# Altium footprint library OT Library.PcbLib: 396 footprints (part 16 of 25)
Each footprint in its own frame and in the unit in brackets; x right, y up, seen from the top. Pads: shape width x height; smd on the part's side, far side on the other; paste and mask are expansions set on the pad; w line width, h text height; cw(c..) or ccw(c..) is an arc to the next point about the centre after c.
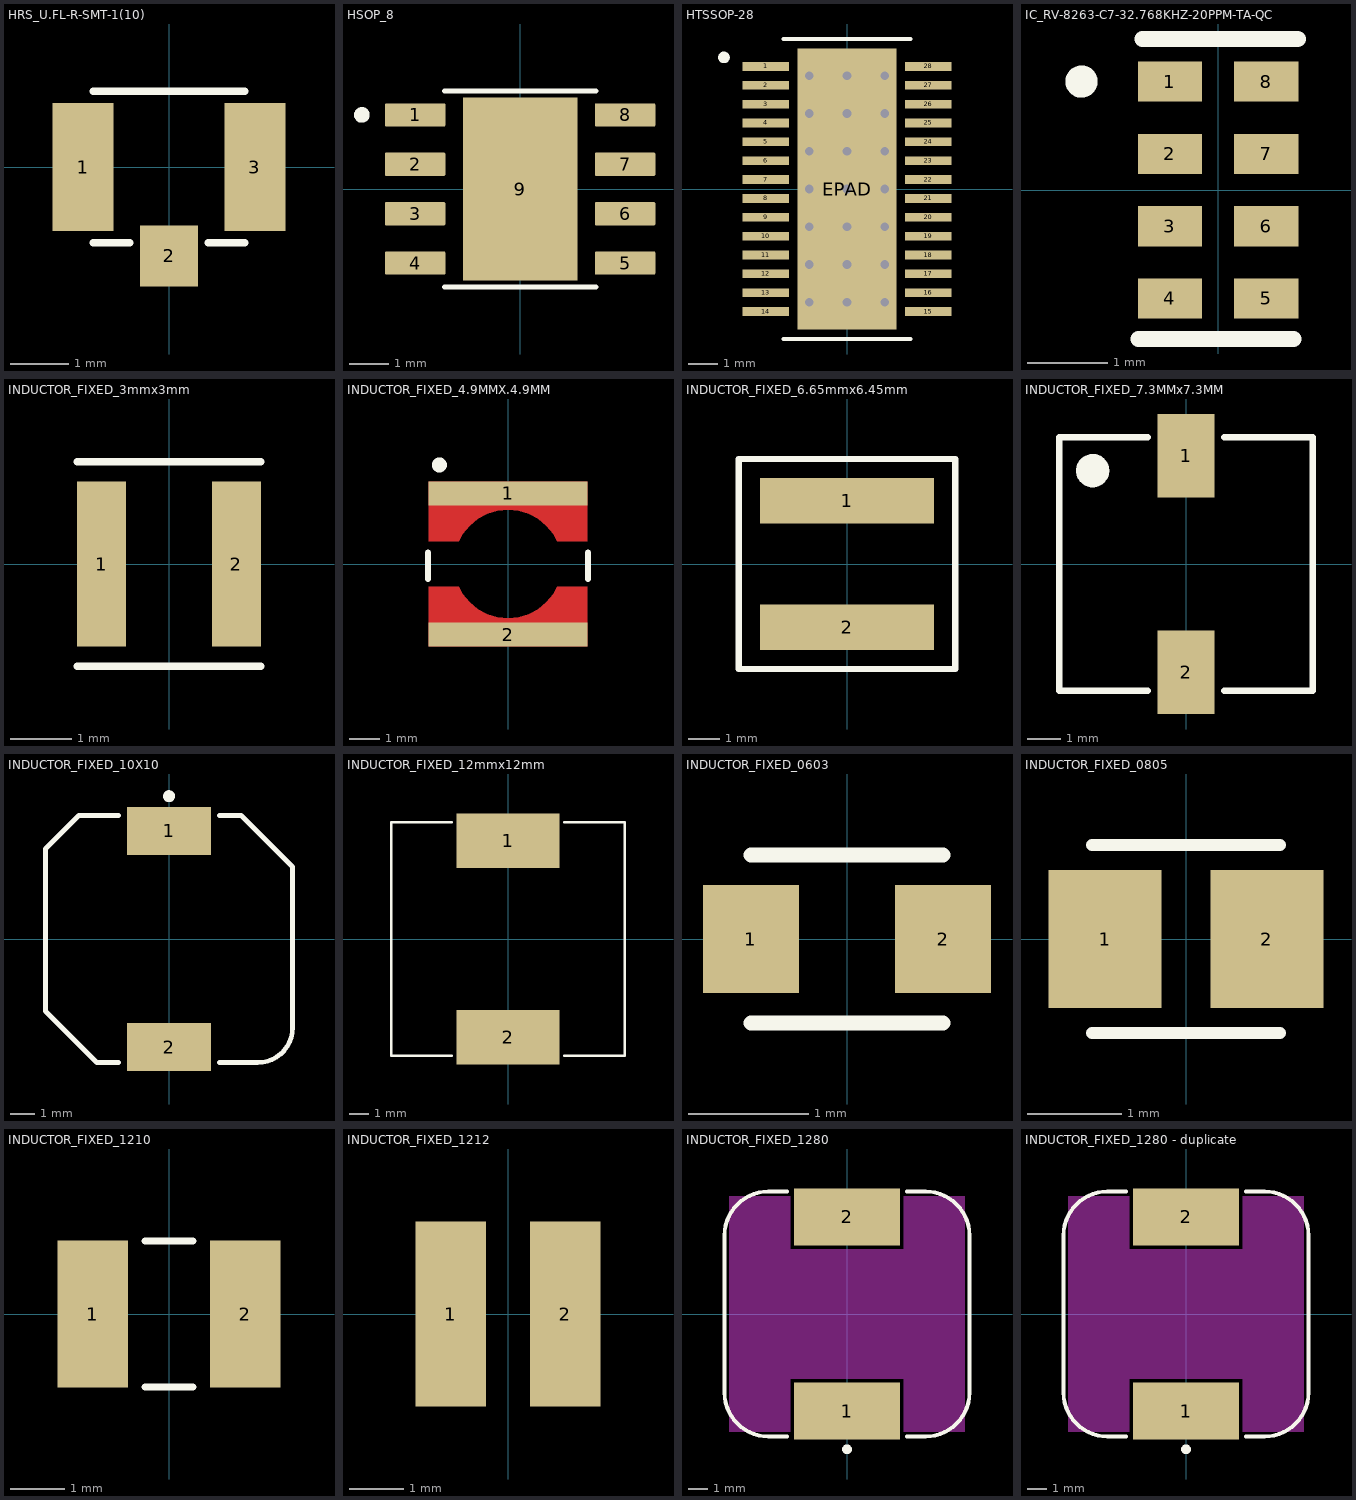
[diagram p15: the footprints below, top view; thin cyan lines are the x and y axes]

## HRS_U.FL-R-SMT-1(10) [mm]
pads (3):
  rect 1.05x2.2 smd: 1(-1.475,0) 3(1.475,0)
  rect 1x1.05 smd: 2(0,-1.525)
Top Overlay:
  lines w0.127: -1.3,-1.3 -0.67,-1.3 ; -1.3,1.3 1.3,1.3 ; 0.67,-1.3 1.3,-1.3
3D body: height 1.26, standoff 0.01, extent -1.5,-1.55 1.5,1.55

## HSOP_8 [mm]
height 1.7
pads (9):
  rrect10% 1.55x0.6 smd mask+0: 1(-2.7,1.905) 2(-2.7,0.635) 3(-2.7,-0.635) 4(-2.7,-1.905) 5(2.7,-1.905) 6(2.7,-0.635) 7(2.7,0.635) 8(2.7,1.905)
  rect 2.95x4.7 smd paste-3 mask+0: 9(0,0)
Top Overlay:
  circle w0.2: c-4.07,1.905 r0.1
  lines w0.127: -1.95,-2.525 1.95,-2.525 ; -1.95,2.525 1.95,2.525
Top Paste:
  region: 1.3,-1.55 -1.3,-1.55 -1.3,1.55 1.3,1.55
Top Solder:
  drawing of 9 lines, arcs and shapes, not listed
3D body: height 1.7, standoff 0, extent -3,-2.45 3,2.45

## HTSSOP-28 [mm]
pads (50):
  rect 1.6x0.3 smd paste-2 mask+0: 1(-2.8,4.225) 2(-2.8,3.575) 3(-2.8,2.925) 4(-2.8,2.275) 5(-2.8,1.625) 6(-2.8,0.975) 7(-2.8,0.325) 8(-2.8,-0.325) 9(-2.8,-0.975) 10(-2.8,-1.625) 11(-2.8,-2.275) 12(-2.8,-2.925) 13(-2.8,-3.575) 14(-2.8,-4.225) 15(2.8,-4.225) 16(2.8,-3.575) 17(2.8,-2.925) 18(2.8,-2.275) 19(2.8,-1.625) 20(2.8,-0.975) 21(2.8,-0.325) 22(2.8,0.325) 23(2.8,0.975) 24(2.8,1.625) 25(2.8,2.275) 26(2.8,2.925) 27(2.8,3.575) 28(2.8,4.225)
  round 0.5 hole 0.3 mask+0: EPAD(-1.3,-3.9) EPAD(-1.3,-2.6) EPAD(-1.3,-1.3) EPAD(-1.3,0) EPAD(-1.3,1.3) EPAD(-1.3,2.6) EPAD(-1.3,3.9) EPAD(0,-3.9) EPAD(0,-2.6) EPAD(0,-1.3) EPAD(0,0) EPAD(0,1.3) EPAD(0,2.6) EPAD(0,3.9) EPAD(1.3,-3.9) EPAD(1.3,-2.6) EPAD(1.3,-1.3) EPAD(1.3,0) EPAD(1.3,1.3) EPAD(1.3,2.6) EPAD(1.3,3.9)
  rect 3.4x9.7 smd paste-6 mask+0: EPAD(0,0)
Top Overlay:
  circle w0.2: c-4.24,4.535 r0.1
  lines w0.127: -2.2,-5.17 2.2,-5.17 ; -2.2,5.17 2.2,5.17
Top Paste:
  region: 1.2,-3.23 -1.2,-3.23 -1.2,3.23 1.2,3.23
  region: -2.025,4.1 -3.575,4.1 -3.575,4.35 -2.025,4.35
  region: 3.575,4.1 2.025,4.1 2.025,4.35 3.575,4.35
  region: -2.025,3.45 -3.575,3.45 -3.575,3.7 -2.025,3.7
  region: 3.575,3.45 2.025,3.45 2.025,3.7 3.575,3.7
  region: -2.025,2.8 -3.575,2.8 -3.575,3.05 -2.025,3.05
  region: 3.575,2.8 2.025,2.8 2.025,3.05 3.575,3.05
  region: -2.025,2.15 -3.575,2.15 -3.575,2.4 -2.025,2.4
  region: 3.575,2.15 2.025,2.15 2.025,2.4 3.575,2.4
  region: -2.025,1.5 -3.575,1.5 -3.575,1.75 -2.025,1.75
  region: 3.575,1.5 2.025,1.5 2.025,1.75 3.575,1.75
  region: -2.025,0.85 -3.575,0.85 -3.575,1.1 -2.025,1.1
  region: 3.575,0.85 2.025,0.85 2.025,1.1 3.575,1.1
  region: -2.025,0.2 -3.575,0.2 -3.575,0.45 -2.025,0.45
  region: 3.575,0.2 2.025,0.2 2.025,0.45 3.575,0.45
  region: -2.025,-0.45 -3.575,-0.45 -3.575,-0.2 -2.025,-0.2
  region: -2.025,-1.1 -3.575,-1.1 -3.575,-0.85 -2.025,-0.85
  region: -2.025,-1.75 -3.575,-1.75 -3.575,-1.5 -2.025,-1.5
  region: -2.025,-2.4 -3.575,-2.4 -3.575,-2.15 -2.025,-2.15
  region: -2.025,-3.05 -3.575,-3.05 -3.575,-2.8 -2.025,-2.8
  region: -2.025,-3.7 -3.575,-3.7 -3.575,-3.45 -2.025,-3.45
  region: -2.025,-4.35 -3.575,-4.35 -3.575,-4.1 -2.025,-4.1
  region: 3.575,-0.45 2.025,-0.45 2.025,-0.2 3.575,-0.2
  region: 3.575,-1.1 2.025,-1.1 2.025,-0.85 3.575,-0.85
  region: 3.575,-1.75 2.025,-1.75 2.025,-1.5 3.575,-1.5
  region: 3.575,-2.4 2.025,-2.4 2.025,-2.15 3.575,-2.15
  region: 3.575,-3.05 2.025,-3.05 2.025,-2.8 3.575,-2.8
  region: 3.575,-3.7 2.025,-3.7 2.025,-3.45 3.575,-3.45
  region: 3.575,-4.35 2.025,-4.35 2.025,-4.1 3.575,-4.1
Top Solder:
  region: 1.2,-3.23 -1.2,-3.23 -1.2,3.23 1.2,3.23
  region: -1.93,4.005 -3.67,4.005 -3.67,4.445 -1.93,4.445
  region: 3.67,4.005 1.93,4.005 1.93,4.445 3.67,4.445
  region: -1.93,3.355 -3.67,3.355 -3.67,3.795 -1.93,3.795
  region: 3.67,3.355 1.93,3.355 1.93,3.795 3.67,3.795
  region: -1.93,2.705 -3.67,2.705 -3.67,3.145 -1.93,3.145
  region: 3.67,2.705 1.93,2.705 1.93,3.145 3.67,3.145
  region: -1.93,2.055 -3.67,2.055 -3.67,2.495 -1.93,2.495
  region: 3.67,2.055 1.93,2.055 1.93,2.495 3.67,2.495
  region: -1.93,1.405 -3.67,1.405 -3.67,1.845 -1.93,1.845
  region: 3.67,1.405 1.93,1.405 1.93,1.845 3.67,1.845
  region: -1.93,0.755 -3.67,0.755 -3.67,1.195 -1.93,1.195
  region: 3.67,0.755 1.93,0.755 1.93,1.195 3.67,1.195
  region: -1.93,0.105 -3.67,0.105 -3.67,0.545 -1.93,0.545
  region: 3.67,0.105 1.93,0.105 1.93,0.545 3.67,0.545
  region: -1.93,-0.545 -3.67,-0.545 -3.67,-0.105 -1.93,-0.105
  region: -1.93,-1.195 -3.67,-1.195 -3.67,-0.755 -1.93,-0.755
  region: -1.93,-1.845 -3.67,-1.845 -3.67,-1.405 -1.93,-1.405
  region: -1.93,-2.495 -3.67,-2.495 -3.67,-2.055 -1.93,-2.055
  region: -1.93,-3.145 -3.67,-3.145 -3.67,-2.705 -1.93,-2.705
  region: -1.93,-3.795 -3.67,-3.795 -3.67,-3.355 -1.93,-3.355
  region: -1.93,-4.445 -3.67,-4.445 -3.67,-4.005 -1.93,-4.005
  region: 3.67,-0.545 1.93,-0.545 1.93,-0.105 3.67,-0.105
  region: 3.67,-1.195 1.93,-1.195 1.93,-0.755 3.67,-0.755
  region: 3.67,-1.845 1.93,-1.845 1.93,-1.405 3.67,-1.405
  region: 3.67,-2.495 1.93,-2.495 1.93,-2.055 3.67,-2.055
  region: 3.67,-3.145 1.93,-3.145 1.93,-2.705 3.67,-2.705
  region: 3.67,-3.795 1.93,-3.795 1.93,-3.355 3.67,-3.355
  region: 3.67,-4.445 1.93,-4.445 1.93,-4.005 3.67,-4.005
3D body: height 1.2, standoff 0, extent -3.2,-4.85 3.2,4.85

## IC_RV-8263-C7-32.768KHZ-20PPM-TA-QC [mm]
height 0.8
pads (8):
  rect 0.8x0.5 smd: 1(-0.6,1.35) 2(-0.6,0.45) 3(-0.6,-0.45) 4(-0.6,-1.35) 5(0.6,-1.35) 6(0.6,-0.45) 7(0.6,0.45) 8(0.6,1.35)
Top Overlay:
  circle w0.2: c-1.7,1.35 r0.1
  lines w0.2: -0.991,-1.854 0.94,-1.854 ; -0.94,1.88 0.991,1.88
3D body: height 0.8, standoff 0, extent -0.75,-1.6 0.75,1.6

## INDUCTOR_FIXED_3mmx3mm [mm] "0.118\" L x 0.118\" W (3.00mm x 3.00mm)"
pads (2):
  rect 0.8x2.7 smd: 1(-1.1,0) 2(1.1,0)
Top Overlay:
  lines w0.127: -1.5,-1.67 1.5,-1.67 ; -1.5,1.67 1.5,1.67
3D body: height 1.2, standoff 0, extent -1.5,-1.5 1.5,1.5

## INDUCTOR_FIXED_4.9MMX.4.9MM [mm] "5030"
height 2.85
pads (2):
  rect 5.3x0.8 smd: 1(0,2.35) 2(0,-2.35)
Top Layer:
  region: -2.65,0.75 -2.65,2.75 2.65,2.75 2.65,0.75 1.639,0.751 1.504,1.005 1.279,1.279 1.005,1.504 0.692,1.671 0.353,1.774 0,1.809 -0.353,1.774 -0.692,1.671 -1.005,1.504 -1.279,1.279 -1.504,1.005 -1.638,0.754 -1.635,0.752 -1.635,0.75
  region: -2.65,-0.75 -2.65,-2.75 2.65,-2.75 2.65,-0.75 1.639,-0.751 1.504,-1.005 1.279,-1.279 1.005,-1.504 0.692,-1.671 0.353,-1.774 0,-1.809 -0.353,-1.774 -0.692,-1.671 -1.005,-1.504 -1.279,-1.279 -1.504,-1.005 -1.638,-0.754 -1.635,-0.752 -1.635,-0.75
Top Overlay:
  circle w0.25: c-2.286,3.302 r0.125
  lines w0.2: -2.667,-0.508 -2.667,0.381 ; 2.667,-0.508 2.667,0.381
Test Points Top:
  text ".Designator" at -5.998,-0.4 h1.2
3D body: height 2.85, standoff 0, extent -2.45,-2.45 2.45,2.45

## INDUCTOR_FIXED_6.65mmx6.45mm [mm] "SMT Power Inductor, 2-Leads, body 6.65x6.45mm"
height 3
pads (2):
  rect 5.5x1.45 smd: 1(0,2) 2(0,-2)
Top Overlay:
  lines w0.2: -3.425,-3.325 3.425,-3.325 3.425,3.325 -3.425,3.325 -3.425,-3.325
3D body: height 3, standoff 0, extent -3.325,-3.225 3.325,3.225

## INDUCTOR_FIXED_7.3MMx7.3MM [mm] "SMD Shielded Power Inductor, 2-leads, body 7.3x7.3mm"
height 3.5
pads (2):
  rect 1.7x2.5 smd: 1(0,3.25) 2(0,-3.25)
Top Overlay:
  circle w0.5: c-2.8,2.8 r0.25
  lines w0.2: -1.15,-3.8 -3.8,-3.8 -3.8,3.8 -1.15,3.8 ; 1.15,-3.8 3.8,-3.8 3.8,3.8 1.15,3.8
3D body: height 3.2, standoff 0, extent -3.65,-3.65 3.65,3.65

## INDUCTOR_FIXED_10X10 [mm] "SMD Shielded Power Inductor, 2-leads, body 10x10mm"
height 3
pads (2):
  rect 3.5x2 smd: 1(0,4.5) 2(0,-4.5)
Top Overlay:
  circle w0.25: c0,5.95 r0.125
  lines w0.2: -2.1,-5.15 -3,-5.15 -5.15,-3 -5.15,3.75 -3.75,5.15 -2.1,5.15 ; 2.1,-5.15 3.7,-5.15 ccw(c3.7,-3.7) 5.15,-3.7 5.15,3 3,5.15 2.1,5.15
3D body: height 2.85, standoff 0, extent -5,-5 5,5

## INDUCTOR_FIXED_12mmx12mm [mm] "0.472\" L x 0.472\" W (12.00mm x 12.00mm)"
height 10
pads (2):
  rect 5.3x2.8 smd: 1(0,5.05) 2(0,-5.05)
Top Overlay:
  lines w0.127: -2.89,-6 -6,-6 -6,6 -2.89,6 ; 2.89,-6 6,-6 6,6 2.89,6
3D body: height 10, standoff 0, extent -6,-6 6,6

## INDUCTOR_FIXED_0603 [mm] "SMD Multilayer Ceramic Inductor, body 1.60x0.80mm"
height 0.95
pads (2):
  rect 0.8x0.9 smd: 1(-0.8,0) 2(0.8,0)
Top Overlay:
  lines w0.127: -0.8,-0.7 0.8,-0.7 ; -0.8,0.7 0.8,0.7
3D body: height 0.8, standoff 0, extent -0.8,-0.4 0.8,0.4

## INDUCTOR_FIXED_0805 [mm]
pads (2):
  rect 1.2x1.47 smd: 1(-0.86,0) 2(0.86,0)
Top Overlay:
  lines w0.127: -1,-1 1,-1 ; -1,1 1,1
3D body: height 1.05, standoff 0, extent -1,-0.625 1,0.625

## INDUCTOR_FIXED_1210 [mm] "0.126\" L x 0.098\" W (3.20mm x 2.50mm)"
height 2.7
pads (2):
  rect 1.3x2.72 smd: 1(-1.41,0) 2(1.41,0)
Top Overlay:
  lines w0.127: -0.44,-1.35 0.44,-1.35 ; -0.44,1.35 0.44,1.35
3D body: height 2.7, standoff 0, extent -1.6,-1.25 1.6,1.25

## INDUCTOR_FIXED_1212 [mm] "0.118\" L x 0.118\" W (3.00mm x 3.00mm)"
height 2
pads (2):
  rect 1.3x3.4 smd: 1(-1.05,0) 2(1.05,0)
3D body: height 2, standoff 0, extent -1.5,-1.5 1.5,1.5

## INDUCTOR_FIXED_1280 [mm] "SMT Shielded Power Inductor, 2-leads, body 12x12mm"
height 8
pads (2):
  rect 5.4x2.9 smd: 1(0,-4.95) 2(0,4.95)
Top Layer keep-out:
  region: -6,6 -2.9,6 -2.9,3.3 2.9,3.3 2.9,6 6,6 6,-6 2.9,-6 2.9,-3.3 -2.9,-3.3 -2.9,-6 -6,-6
Top Overlay:
  circle w0.25: c0,-6.9 r0.125
  lines w0.2: -3.05,-6.25 -4,-6.25 cw(c-4,-4) -6.25,-4 -6.25,4 cw(c-4,4) -4,6.25 -3.05,6.25 ; 3.05,-6.25 4,-6.25 ccw(c4,-4) 6.25,-4 6.25,4 ccw(c4,4) 4,6.25 3.05,6.25
3D body: height 7.51, standoff 0.05, extent -6,-6 6,6

## INDUCTOR_FIXED_1280 - duplicate [mm] "SMT Shielded Power Inductor, 2-leads, body 12x12mm"
height 8
pads (2):
  rect 5.4x2.9 smd: 1(0,-4.95) 2(0,4.95)
Top Layer keep-out:
  region: -6,6 -2.9,6 -2.9,3.3 2.9,3.3 2.9,6 6,6 6,-6 2.9,-6 2.9,-3.3 -2.9,-3.3 -2.9,-6 -6,-6
Top Overlay:
  circle w0.25: c0,-6.9 r0.125
  lines w0.2: -3.05,-6.25 -4,-6.25 cw(c-4,-4) -6.25,-4 -6.25,4 cw(c-4,4) -4,6.25 -3.05,6.25 ; 3.05,-6.25 4,-6.25 ccw(c4,-4) 6.25,-4 6.25,4 ccw(c4,4) 4,6.25 3.05,6.25
3D body: height 7.51, standoff 0.05, extent -6,-6 6,6